# Altium footprint library lib_protel_HC_BOINA.PCBLIB: 726 footprints (part 46 of 46)
Each footprint in its own frame and in the unit in brackets; x right, y up, seen from the top. Pads: shape width x height; smd on the part's side, far side on the other; paste and mask are expansions set on the pad; w line width, h text height; cw(c..) or ccw(c..) is an arc to the next point about the centre after c.
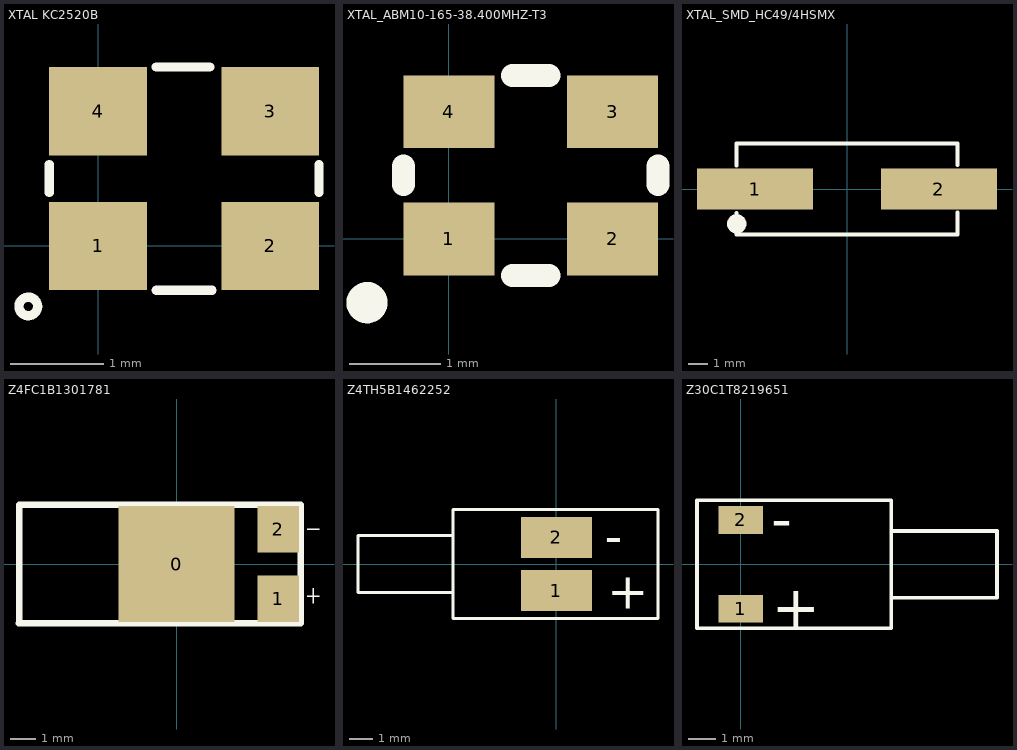
[diagram p45: the footprints below, top view; thin cyan lines are the x and y axes]

## XTAL KC2520B [mm] "CLOCK 24MHZ"
height 0.7
pads (4):
  rect 1.05x0.95 smd mask+0.05: 1(0,0) 2(1.85,0) 3(1.85,1.45) 4(0,1.45)
Top Overlay:
  circle w0.1: c-0.75,-0.65 r0.1
  lines w0.1: -0.525,0.575 -0.525,0.875 ; 0.625,-0.475 1.225,-0.475 ; 0.625,1.925 1.2,1.925 ; 2.375,0.575 2.375,0.875

## XTAL_ABM10-165-38.400MHZ-T3 [mm]
pads (4):
  rect 1x0.8 smd: 1(0,0) 2(1.8,0) 3(1.8,1.4) 4(0,1.4)
Top Overlay:
  circle w0.254: c-0.9,-0.7 r0.1
  lines w0.254: -0.5,0.6 -0.5,0.8 ; 0.7,-0.4 1.1,-0.4 ; 0.7,1.8 1.1,1.8 ; 2.3,0.6 2.3,0.8
3D body "User Library-ABM10_Xtal.step": height 0.7, standoff -0.01, extent -0.4,-0.35 2.2,1.75

## XTAL_SMD_HC49/4HSMX [mm]
height 4.3
pads (2):
  rect 6x2.1 smd: 1(-4.75,0) 2(4.75,0)
Top Overlay:
  circle w0.5: c-5.7,-1.8 r0.25
  lines w0.203: -5.7,-1.25 -5.7,-2.35 5.7,-2.35 5.7,-1.2 ; -5.7,1.2 -5.7,2.35 5.7,2.35 5.7,1.25
3D body "User Library-Crystal HC49_US-SM.STEP": height 4.3, standoff 0, extent -6.4,-2.415 6.4,2.415

## Z4FC1B1301781 [mm] "micromotor"
height 4.85
pads (3):
  rect 4.5x4.5 smd mask+0.1: 0(0,0)
  rect 1.6x1.8 smd mask+0.1: 1(3.937,-1.346) 2(3.937,1.346)
Top Overlay:
  lines w0.051: 5.055,-1.245 5.512,-1.245 ; 5.055,1.346 5.512,1.346 ; 5.283,-1.524 5.283,-0.94
  lines w0.254: -6.099,-2.286 4.801,-2.286 4.801,2.284 ; -6.096,-2.286 -6.096,2.286 4.801,2.286

## Z4TH5B1462252 [mm] "Vibrating Motor"
pads (2):
  rect 3x1.75 smd: 1(0,-1.125) 2(0,1.125)
Top Overlay:
  lines w0.127: -4.4,1.2 -8.4,1.2 -8.4,0 -8.4,-1.2 -4.375,-1.2 ; -4.375,-2.3 -4.375,2.3 0.025,2.3 4.3,2.3 4.3,-2.3 0.025,-2.3 -4.375,-2.3
  text "-" at 2.05,0.425 h1.52
  text "+" at 2.15,-1.9 h1.52

## Z30C1T8219651 [mm] "Vibrating Motor"
pads (2):
  rect 1.6x1 smd: 1(0,-1.6) 2(0,1.6)
Top Overlay:
  lines w0.127: 5.425,-1.2 9.225,-1.2 9.225,0 9.225,1.2 5.425,1.2 ; -1.575,-2.3 -1.575,2.3 5.425,2.3 5.425,-2.3 -1.575,-2.3
  text "+" at 1.125,-2.3 h1.52
  text "-" at 1.1,0.9 h1.52